# Altium footprint library pcblib.PcbLib: 92 footprints (part 1 of 6)
Each footprint in its own frame and in the unit in brackets; x right, y up, seen from the top. Pads: shape width x height; smd on the part's side, far side on the other; paste and mask are expansions set on the pad; w line width, h text height; cw(c..) or ccw(c..) is an arc to the next point about the centre after c.
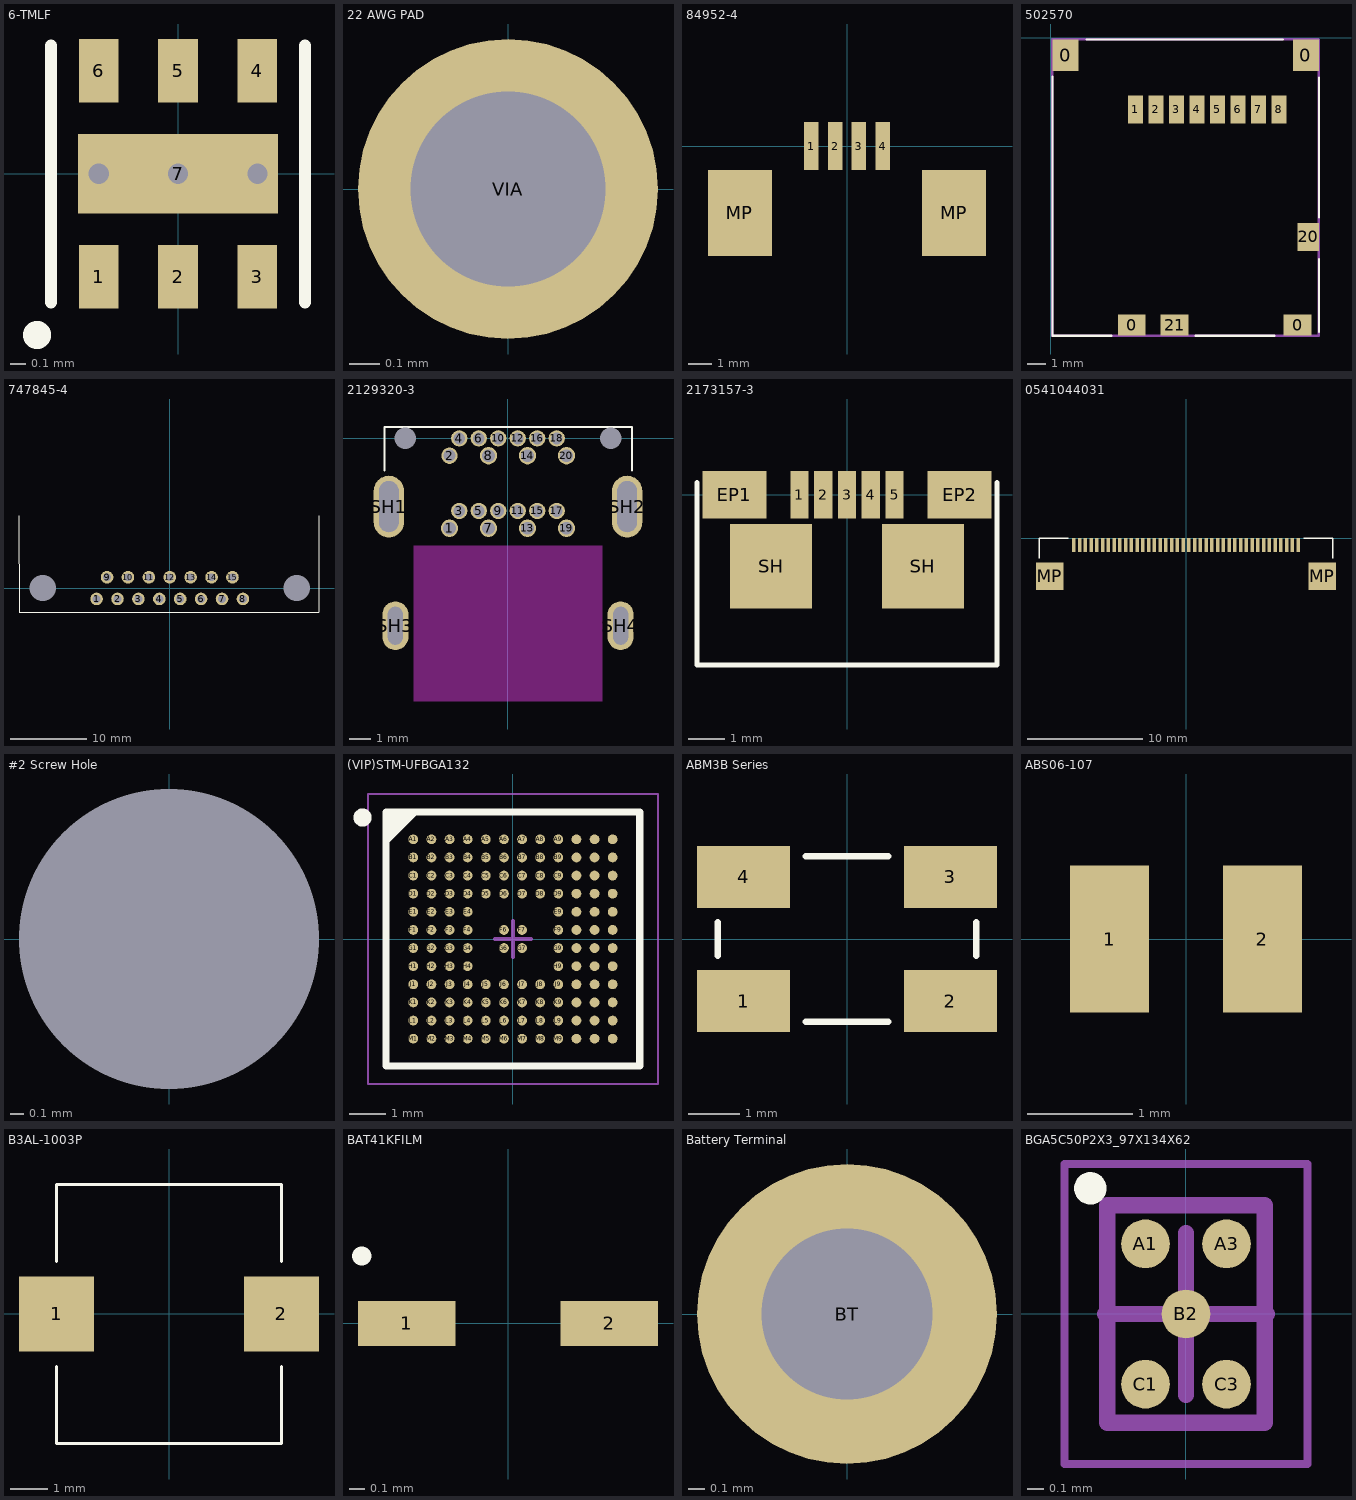
[diagram p0: the footprints below, top view; thin cyan lines are the x and y axes]

## 6-TMLF [mm] "6-TMLF® (1.6x1.6)"
height 0.55
pads (7):
  rect 0.25x0.4 smd: 1(-0.5,-0.65) 2(0,-0.65) 3(0.5,-0.65) 4(0.5,0.65) 5(0,0.65) 6(-0.5,0.65)
  rect 1.26x0.5 smd: 7(0,0)
via 0.5,0 diameter 0.254 hole 0.127
via 0,0 diameter 0.254 hole 0.127
via -0.5,0 diameter 0.254 hole 0.127
Top Overlay:
  circle w0.127: c-0.889,-1.016 r0.025
  lines w0.076: -0.8,-0.81 -0.8,0.81 ; 0.8,-0.81 0.8,0.81
3D body: height 0.55, standoff 0, extent -0.8,-0.81 0.8,0.81

## 22 AWG PAD [mm] "Pad/Via for 22 awg wire"
pads (1):
  round 1 hole 0.65: VIA(0,0)

## 84952-4 [mm] "CONN FPC BOTTOM 4POS 1.00MM R/A"
pads (6):
  rect 0.61x2 smd: 1(-1.5,0) 2(-0.5,0) 3(0.5,0) 4(1.5,0)
  rect 2.68x3.6 smd: MP(-4.49,-2.8) MP(4.49,-2.8)
3D body: height 2.56, standoff 0, extent -5.96,-6.44 5.96,0.1

## 502570 [mm] "CONN MICRO SD CARD PUSH-PUSH R/A"
height 1.4
pads (14):
  rect 1.4x1.7 smd: 0(0.802,-0.95) 0(13.702,-0.95)
  rect 1.5x1.15 smd: 0(4.352,-15.425) 0(13.252,-15.425) 21(6.652,-15.425)
  rect 0.8x1.5 smd: 1(4.552,-3.85) 2(5.652,-3.85) 3(6.752,-3.85) 4(7.852,-3.85) 5(8.952,-3.85) 6(10.052,-3.85) 7(11.152,-3.85) 8(12.252,-3.85)
  rect 1.15x1.5 smd: 20(13.827,-10.7)
Top Overlay:
  lines w0.127: 0.102,-2.1 0.102,-16 3.252,-16 ; 1.927,-0.1 12.452,-0.1 ; 7.777,-16 12.002,-16 ; 14.402,-15.8 14.402,-11.9 ; 14.402,-9.65 14.402,-2.15
Mechanical 13:
  lines w0.127: 0.102,-16 14.402,-16 14.402,-0.1 0.102,-0.1 0.102,-16
Mechanical 15:
  lines w0.1: 0.077,-16.025 0.077,-0.075 14.377,-0.075 14.377,-16.025 0.077,-16.025
3D body: height 1.78, standoff -0.03, extent 0.356,-15.851 14.156,-0.351

## 747845-4 [mil] "CONN D-SUB RCPT R/A 15POS PCB AU"
pads (17):
  round 65 hole 41: 1(-378,-56) 2(-270,-56) 3(-162,-56) 4(-54,-56) 5(54,-56) 6(162,-56) 7(270,-56) 8(378,-56) 9(-324,56) 10(-216,56) 11(-108,56) 12(0,56) 13(108,56) 14(216,56) 15(324,56)
  round 0 hole 135 unplated: MH(-656,0) MH(656,0)
Top Overlay:
  lines w5: -778.93,375 -778.93,-125.99 771.06,-125.99 771.06,375
3D body: height 483.22, standoff -139.18, extent -778.93,-125.99 771.06,617.91

## 2129320-3 [mm] "Mini Displayport Reverse Offset"
pads (26):
  round 0.8 hole 0.58: 1(-2.7,-4.15) 7(-0.9,-4.15) 8(-0.9,-0.8) 13(0.9,-4.15) 14(0.9,-0.8) 19(2.7,-4.15) 20(2.7,-0.8)
  round 0.75 hole 0.55: 2(-2.7,-0.8) 3(-2.25,-3.35) 4(-2.25,0) 5(-1.35,-3.35) 6(-1.35,0) 9(-0.45,-3.35) 10(-0.45,0) 11(0.45,-3.35) 12(0.45,0) 15(1.35,-3.35) 16(1.35,0) 17(2.25,-3.35) 18(2.25,0)
  round 0 hole 1 unplated: MH(-4.75,0) MH(4.75,0)
  oval 1.4x2.85 hole 0.9 slot 2.35 at 90 deg: SH1(-5.5,-3.15) SH2(5.5,-3.15)
  oval 1.2x2.25 hole 0.7 slot 1.74 at 90 deg: SH3(-5.2,-8.65) SH4(5.2,-8.65)
Top Overlay:
  lines w0.076: -5.7,-1.5 -5.7,0.525 5.725,0.525 5.725,-1.5
Keep-Out Layer:
  board cut-out: -4.35,-4.95 4.35,-4.95 4.35,-12.125 -4.35,-12.125
3D body: height 4.2, standoff -2.2, extent -5.675,-12.125 5.725,0.525

## 2173157-3 [mm] "Splash Proof Micro USB B-Type low MOQ"
pads (9):
  rect 0.5x1.3 smd: 1(-1.3,0) 2(-0.65,0) 3(0,0) 4(0.65,0) 5(1.3,0)
  rect 1.75x1.3 smd: EP1(-3.075,0) EP2(3.075,0)
  rect 2.25x2.3 smd: SH(-2.075,-1.95) SH(2.075,-1.95)
Top Overlay:
  lines w0.127: -4.1,0.35 -4.1,-4.65 4.1,-4.65 4.1,0.35
3D body: height 3.76, standoff -0.04, extent -4.1,-4.76 4.1,0.35

## 0541044031 [mm] "CONN FFC 40POS 0.50MM SMD R/A"
pads (42):
  rect 0.3x1.2 smd: 1(9.75,-0.6) 2(9.25,-0.6) 3(8.75,-0.6) 4(8.25,-0.6) 5(7.75,-0.6) 6(7.25,-0.6) 7(6.75,-0.6) 8(6.25,-0.6) 9(5.75,-0.6) 10(5.25,-0.6) 11(4.75,-0.6) 12(4.25,-0.6) 13(3.75,-0.6) 14(3.25,-0.6) 15(2.75,-0.6) 16(2.25,-0.6) 17(1.75,-0.6) 18(1.25,-0.6) 19(0.75,-0.6) 20(0.25,-0.6) 21(-0.25,-0.6) 22(-0.75,-0.6) 23(-1.25,-0.6) 24(-1.75,-0.6) 25(-2.25,-0.6) 26(-2.75,-0.6) 27(-3.25,-0.6) 28(-3.75,-0.6) 29(-4.25,-0.6) 30(-4.75,-0.6) 31(-5.25,-0.6) 32(-5.75,-0.6) 33(-6.25,-0.6) 34(-6.75,-0.6) 35(-7.25,-0.6) 36(-7.75,-0.6) 37(-8.25,-0.6) 38(-8.75,-0.6) 39(-9.25,-0.6) 40(-9.75,-0.6)
  rect 2.4x2.4 smd: MP(-11.85,-3.3) MP(11.85,-3.3)
Top Overlay:
  lines w0.127: -12.75,-1.75 -12.75,0 -10.25,0 ; 10.25,0 12.75,0 12.75,-1.75
3D body: height 2, standoff -0.05, extent -12.75,-7.15 12.75,0

## #2 Screw Hole [mil] "Screw Hole for #2 Screw"
pads (1):
  round 0 hole 89 unplated: SH(0,0)

## (VIP)STM-UFBGA132 [mm] "BGA, 132-Balls, Body 7x7mm, Pitch 0.5mm"
height 0.6
pads (132):
  round 0.27 smd: A1(-2.75,2.75) A2(-2.25,2.75) A3(-1.75,2.75) A4(-1.25,2.75) A5(-0.75,2.75) A6(-0.25,2.75) A7(0.25,2.75) A8(0.75,2.75) A9(1.25,2.75) A10(1.75,2.75) A11(2.25,2.75) A12(2.75,2.75) B1(-2.75,2.25) B2(-2.25,2.25) B3(-1.75,2.25) B4(-1.25,2.25) B5(-0.75,2.25) B6(-0.25,2.25) B7(0.25,2.25) B8(0.75,2.25) B9(1.25,2.25) B10(1.75,2.25) B11(2.25,2.25) B12(2.75,2.25) C1(-2.75,1.75) C2(-2.25,1.75) C3(-1.75,1.75) C4(-1.25,1.75) C5(-0.75,1.75) C6(-0.25,1.75) C7(0.25,1.75) C8(0.75,1.75) C9(1.25,1.75) C10(1.75,1.75) C11(2.25,1.75) C12(2.75,1.75) D1(-2.75,1.25) D2(-2.25,1.25) D3(-1.75,1.25) D4(-1.25,1.25) D5(-0.75,1.25) D6(-0.25,1.25) D7(0.25,1.25) D8(0.75,1.25) D9(1.25,1.25) D10(1.75,1.25) D11(2.25,1.25) D12(2.75,1.25) E1(-2.75,0.75) E2(-2.25,0.75) E3(-1.75,0.75) E4(-1.25,0.75) E9(1.25,0.75) E10(1.75,0.75) E11(2.25,0.75) E12(2.75,0.75) F1(-2.75,0.25) F2(-2.25,0.25) F3(-1.75,0.25) F4(-1.25,0.25) F6(-0.25,0.25) F7(0.25,0.25) F9(1.25,0.25) F10(1.75,0.25) F11(2.25,0.25) F12(2.75,0.25) G1(-2.75,-0.25) G2(-2.25,-0.25) G3(-1.75,-0.25) G4(-1.25,-0.25) G6(-0.25,-0.25) G7(0.25,-0.25) G9(1.25,-0.25) G10(1.75,-0.25) G11(2.25,-0.25) G12(2.75,-0.25) H1(-2.75,-0.75) H2(-2.25,-0.75) H3(-1.75,-0.75) H4(-1.25,-0.75) H9(1.25,-0.75) H10(1.75,-0.75) H11(2.25,-0.75) H12(2.75,-0.75) J1(-2.75,-1.25) J2(-2.25,-1.25) J3(-1.75,-1.25) J4(-1.25,-1.25) J5(-0.75,-1.25) J6(-0.25,-1.25) J7(0.25,-1.25) J8(0.75,-1.25) J9(1.25,-1.25) J10(1.75,-1.25) J11(2.25,-1.25) J12(2.75,-1.25) K1(-2.75,-1.75) K2(-2.25,-1.75) K3(-1.75,-1.75) K4(-1.25,-1.75) K5(-0.75,-1.75) K6(-0.25,-1.75) K7(0.25,-1.75) K8(0.75,-1.75) K9(1.25,-1.75) K10(1.75,-1.75) K11(2.25,-1.75) K12(2.75,-1.75) L1(-2.75,-2.25) L2(-2.25,-2.25) L3(-1.75,-2.25) L4(-1.25,-2.25) L5(-0.75,-2.25) L6(-0.25,-2.25) L7(0.25,-2.25) L8(0.75,-2.25) L9(1.25,-2.25) L10(1.75,-2.25) L11(2.25,-2.25) L12(2.75,-2.25) M1(-2.75,-2.75) M2(-2.25,-2.75) M3(-1.75,-2.75) M4(-1.25,-2.75) M5(-0.75,-2.75) M6(-0.25,-2.75) M7(0.25,-2.75) M8(0.75,-2.75) M9(1.25,-2.75) M10(1.75,-2.75) M11(2.25,-2.75) M12(2.75,-2.75)
Top Overlay:
  circle w0.25: c-4.15,3.35 r0.125
  region: -2.707,3.5 -3.5,2.707 -3.5,3.5
  lines w0.2: -3.5,2.707 -2.707,3.5 ; -3.5,-3.5 3.5,-3.5 3.5,3.5 -3.5,3.5 -3.5,-3.5
Mechanical 13:
  lines w0.1: -3.5,-3.5 3.5,-3.5 3.5,3.5 -3.5,3.5 -3.5,-3.5
Mechanical 15:
  lines w0.05: -4,-4 4,-4 4,4 -4,4 -4,-4
  lines w0.1: -0.5,0 0.5,0 ; 0,-0.5 0,0.5
3D body: height 0.6, standoff 0.05, extent -3.5,-3.5 3.5,3.5

## ABM3B Series [mm] "Abaracon Corporation ABM3B Series Crystal Oscillators"
height 1.1
pads (4):
  rect 1.8x1.2 smd: 1(-2,-1.2) 2(2,-1.2) 3(2,1.2) 4(-2,1.2)
Top Overlay:
  lines w0.127: -2.5,-0.325 -2.5,0.325 ; -0.8,-1.6 0.8,-1.6 ; -0.8,1.6 0.8,1.6 ; 2.5,-0.325 2.5,0.325
3D body: height 1.1, standoff -0.01, extent -2.5,-1.587 2.5,1.588

## ABS06-107 [mm] "Abracon Corporations ABS06-107 Tuning Fork Crystak"
height 0.6
pads (2):
  rect 0.75x1.4 smd: 1(-0.725,0) 2(0.725,0)
3D body: height 0.61, standoff 0, extent -1.003,-0.597 1.003,0.597

## B3AL-1003P [mm] "SWITCH TACTILE SPST-NO 0.05A 16V"
pads (2):
  rect 2x2 smd: 1(-3,0) 2(3,0)
Top Overlay:
  lines w0.076: -3,-1.4 -3,-3.45 3,-3.45 3,-1.4 ; -3,1.4 -3,3.45 3,3.45 3,1.4
3D body: height 5, standoff 0, extent -3.3,-3.45 3.3,3.45

## BAT41KFILM [mm] "DIODE SCHOTTKY 100V 200MA SOD523"
pads (2):
  rect 0.65x0.3 smd: 1(-0.675,0) 2(0.675,0)
Top Overlay:
  lines w0.127: -0.976,0.451 -0.975,0.45
3D body: height 0.7, standoff 0, extent -0.8,-0.399 0.8,0.399

## Battery Terminal [mil] "Via Hole for Battery Leads"
pads (1):
  round 70 hole 40: BT(0,0)

## BGA5C50P2X3_97X134X62 [mm] "BGA, 5-Leads, Body 0.97x1.34mmx0.63mm, Pitch 0.50mm"
height 0.63
pads (5):
  round 0.3 smd: A1(-0.25,0.433) A3(0.25,0.433) B2(0,0) C1(-0.25,-0.433) C3(0.25,-0.433)
Top Overlay:
  circle w0.1: c-0.59,0.775 r0.05
Mechanical 13:
  lines w0.1: -0.485,-0.67 -0.485,0.67 0.485,0.67 0.485,-0.67 -0.485,-0.67
Mechanical 15:
  lines w0.05: -0.75,-0.925 -0.75,0.925 0.75,0.925 0.75,-0.925 -0.75,-0.925
  lines w0.1: -0.5,0 0.5,0 ; 0,-0.5 0,0.5
3D body: height 0.63, standoff 0.2, extent -0.485,-0.67 0.485,0.67